# Altium footprint library Connectors THD.PcbLib: 631 footprints (part 20 of 46) (continued)
## HARTING_09 72 164 6904 [mm] "DIN 41612, Type Q, Thru-Hole Press-in; Rows a+b, 64 Position, Straight Male Connector" (continued)
Mechanical 14:
  circle w0.1: c2.24,-84.37 r1.4
  circle w0.1: c2.24,5.63 r1.4
  lines w0.1: -1.83,-83.32 -1.83,-86.87 5.57,-86.87 5.57,8.13 -1.83,8.13 -1.83,4.58 ; -0.81,-86.87 -0.81,-84.37 0.749,-81.67 3.731,-81.67 ; -0.81,8.13 -0.81,5.63 0.749,2.93 3.731,2.93 ; -0.204,-83.32 -3.03,-83.32 -3.03,4.58 -0.204,4.58 ; 0.2,-82.62 -2.48,-82.62 -2.48,3.88 ; 0.2,3.88 -2.48,3.88 ; 0.576,-81.97 -1.83,-81.97 -1.83,3.23 0.576,3.23 ; 1.67,-81.67 1.52,-81.52 ; 1.67,2.93 1.52,2.78 ; 1.97,-81.67 1.97,-81.02 4.37,-81.02 4.37,2.28 1.97,2.28 1.97,2.93 ; 2.62,-81.67 1.52,-80.57 ; 2.62,2.93 1.52,1.83 ; 5.57,-83.323 4.684,-83.32 3.731,-81.67 ; 5.57,4.58 4.684,4.58 3.731,2.93 ; -2.48,3.88 -1.38,2.78 ; -1.38,2.78 -1.38,-81.52 1.52,-81.52 ; -1.38,2.78 1.52,2.78 ; 1.52,-81.52 1.52,-80.57 ; 1.52,-80.57 3.92,-80.57 ; 1.52,1.83 1.52,2.78 ; 1.52,1.83 3.92,1.83 ; 3.731,-81.67 5.02,-81.67 ; 3.731,2.93 5.02,2.93 ; 3.92,-80.57 5.02,-81.67 ; 3.92,-80.57 3.92,1.83 ; 3.92,1.83 5.02,2.93 ; 5.02,-81.67 5.02,2.93
  text "30" at -5.6,-74.36 h1.2
  text "25" at -5.6,-61.66 h1.2
  text "20" at -5.6,-48.96 h1.2
  text "15" at -5.3,-36.26 h1.2
  text "10" at -5.3,-23.56 h1.2
  text "5" at -4.375,-10.91 h1.2
  text "32" at -5.6,-79.44 h1.2
  text "a" at -0.451,1.385 h1.2
  text "1" at -4.175,-0.75 h1.2
Drill Drawing:
  lines w0.1: -1.83,-59.13 -1.83,-80.585 3.92,-80.585 3.92,1.83 -1.83,1.83 -1.83,-21.03
  text "PRESS-FIT TECHNOLOGY diam. 1mm +0.1 -0" at -1.315,-57.225 h1
3D body: height 11.6, standoff -4.8, extent -3.03,-86.87 5.57,8.13

## HARTING_09 73 264 6801 [mm] "Connector; DIN 41612, Har-Bus Type R, Thru-Hole; Rows a+c, 64 Position; Right Angle"
height 9.5
pads (66):
  round 1.7 hole 1: a1(0,0) a2(0,-2.54) a3(0,-5.08) a4(0,-7.62) a5(0,-10.16) a6(0,-12.7) a7(0,-15.24) a8(0,-17.78) a9(0,-20.32) a10(0,-22.86) a11(0,-25.4) a12(0,-27.94) a13(0,-30.48) a14(0,-33.02) a15(0,-35.56) a16(0,-38.1) a17(0,-40.64) a18(0,-43.18) a19(0,-45.72) a20(0,-48.26) a21(0,-50.8) a22(0,-53.34) a23(0,-55.88) a24(0,-58.42) a25(0,-60.96) a26(0,-63.5) a27(0,-66.04) a28(0,-68.58) a29(0,-71.12) a30(0,-73.66) a31(0,-76.2) a32(0,-78.74) c1(-5.08,0) c2(-5.08,-2.54) c3(-5.08,-5.08) c4(-5.08,-7.62) c5(-5.08,-10.16) c6(-5.08,-12.7) c7(-5.08,-15.24) c8(-5.08,-17.78) c9(-5.08,-20.32) c10(-5.08,-22.86) c11(-5.08,-25.4) c12(-5.08,-27.94) c13(-5.08,-30.48) c14(-5.08,-33.02) c15(-5.08,-35.56) c16(-5.08,-38.1) c17(-5.08,-40.64) c18(-5.08,-43.18) c19(-5.08,-45.72) c20(-5.08,-48.26) c21(-5.08,-50.8) c22(-5.08,-53.34) c23(-5.08,-55.88) c24(-5.08,-58.42) c25(-5.08,-60.96) c26(-5.08,-63.5) c27(-5.08,-66.04) c28(-5.08,-68.58) c29(-5.08,-71.12) c30(-5.08,-73.66) c31(-5.08,-76.2) c32(-5.08,-78.74)
  round 3.5 / inner round 3.5 / far side round 5.1 hole 2.8: MTG1(2.54,5.08) MTG2(2.54,-83.82)
Top Overlay:
  lines w0.2: 1.738,-86.32 0.01,-86.32 0.01,-81.395 1.14,-81.395 1.14,2.655 0.01,2.655 0.01,7.58 1.738,7.58 ; 3.556,-86.32 6.14,-86.32 6.14,-84.003 6.14,5.263 6.14,7.58 3.556,7.58 ; 6.14,-81.845 12.06,-81.845 ; 6.14,-80.795 6.77,-80.795 12.06,-80.795 ; 6.14,2.055 6.77,2.055 12.06,2.055 ; 6.14,3.105 12.06,3.105 ; 12.06,-81.845 12.06,-80.795 ; 12.06,-81.845 12.69,-81.215 12.69,-80.165 ; 12.06,-80.795 12.06,2.055 ; 12.06,-80.795 12.69,-80.165 ; 12.06,2.055 12.06,3.105 ; 12.06,2.055 12.69,1.425 ; 12.06,3.105 12.69,2.475 12.69,1.425 ; 12.69,-80.165 12.69,1.425
  text "20" at -8.12,-48.835 h1.2
  text "15" at -8.02,-36.235 h1.2
  text "a" at -0.6,2.04 h1.2
  text "c" at -4.58,2.04 h1.2
  text "25" at -8.1,-61.6 h1.2
  text "32" at -8.12,-79.315 h1.2
  text "10" at -8.02,-23.535 h1.2
  text "30" at -8.12,-74.235 h1.2
  text "1" at -6.695,-0.725 h1.2
  text "5" at -6.895,-10.785 h1.2
Mechanical 8:
  lines w0.1: -5.08,-39.37 12.64,-39.37 ; 5.3,-86.3 5.3,7.5
Mechanical 14:
  circle w0.1: c2.54,5.08 r1.4
  circle w0.1: c2.54,-83.82 r1.4
  lines w0.1: 1.14,-77.97 5.59,-77.97 ; 1.14,-76.97 5.59,-76.97 ; 1.14,-52.57 5.59,-52.57 ; 1.14,-51.57 5.59,-51.57 ; 1.14,-27.17 5.59,-27.17 ; 1.14,-26.17 5.59,-26.17 ; 1.14,-1.77 5.59,-1.77 ; 1.14,-0.77 5.59,-0.77 ; 1.297,5.08 2.54,5.08 ; 6.14,-81.845 12.06,-81.845 ; 6.14,-80.795 6.77,-80.795 ; 6.14,2.055 6.77,2.055 ; 6.14,3.105 12.06,3.105 ; 1.14,-81.395 0.01,-81.395 0.01,-86.32 6.14,-86.32 6.14,-84.003 ; 1.14,-81.395 4.084,-81.395 5.59,-84.003 ; 1.14,-81.395 1.14,2.655 ; 1.14,2.655 0.01,2.655 0.01,7.58 6.14,7.58 6.14,5.263 ; 1.14,2.655 4.084,2.655 5.59,5.263 ; 5.59,-84.003 6.14,-84.003 ; 5.59,-84.003 5.59,-77.72 1.69,-77.72 1.69,-77.22 5.59,-77.22 5.59,-52.32 1.69,-52.32 1.69,-51.82 5.59,-51.82 5.59,-26.92 1.69,-26.92 1.69,-26.42 5.59,-26.42 5.59,-1.52 1.69,-1.52 1.69,-1.02 5.59,-1.02 5.59,5.263 ; 5.59,5.263 6.14,5.263 ; 6.14,-84.003 6.14,5.263 ; 6.77,-80.795 6.77,2.055 ; 6.77,-80.795 12.06,-80.795 ; 6.77,2.055 12.06,2.055 ; 12.06,-81.845 12.06,-80.795 ; 12.06,-81.845 12.69,-81.215 12.69,-80.165 ; 12.06,-80.795 12.06,2.055 ; 12.06,-80.795 12.69,-80.165 ; 12.06,2.055 12.06,3.105 ; 12.06,2.055 12.69,1.425 ; 12.06,3.105 12.69,2.475 12.69,1.425 ; 12.69,-80.165 12.69,1.425
  text "a" at -0.6,2.04 h1.2
  text "c" at -4.58,2.04 h1.2
  text "30" at -8.12,-74.235 h1.2
  text "20" at -8.12,-48.835 h1.2
  text "15" at -8.02,-36.235 h1.2
  text "32" at -8.12,-79.315 h1.2
  text "1" at -6.695,-0.725 h1.2
  text "25" at -8.1,-61.6 h1.2
  text "10" at -8.02,-23.535 h1.2
  text "5" at -6.895,-10.785 h1.2
3D body: height 9.1, standoff -3, extent -5.38,-86.37 12.74,7.63

## HARTING_09 73 296 6801 [mm] "Connector; DIN 41612, Type R, Thru-Hole; Rows a+b+c, 96 Position; Right Angle"
height 9.5
pads (98):
  round 1.7 hole 1: a1(0,0) a2(0,-2.54) a3(0,-5.08) a4(0,-7.62) a5(0,-10.16) a6(0,-12.7) a7(0,-15.24) a8(0,-17.78) a9(0,-20.32) a10(0,-22.86) a11(0,-25.4) a12(0,-27.94) a13(0,-30.48) a14(0,-33.02) a15(0,-35.56) a16(0,-38.1) a17(0,-40.64) a18(0,-43.18) a19(0,-45.72) a20(0,-48.26) a21(0,-50.8) a22(0,-53.34) a23(0,-55.88) a24(0,-58.42) a25(0,-60.96) a26(0,-63.5) a27(0,-66.04) a28(0,-68.58) a29(0,-71.12) a30(0,-73.66) a31(0,-76.2) a32(0,-78.74) b1(-2.54,0) b2(-2.54,-2.54) b3(-2.54,-5.08) b4(-2.54,-7.62) b5(-2.54,-10.16) b6(-2.54,-12.7) b7(-2.54,-15.24) b8(-2.54,-17.78) b9(-2.54,-20.32) b10(-2.54,-22.86) b11(-2.54,-25.4) b12(-2.54,-27.94) b13(-2.54,-30.48) b14(-2.54,-33.02) b15(-2.54,-35.56) b16(-2.54,-38.1) b17(-2.54,-40.64) b18(-2.54,-43.18) b19(-2.54,-45.72) b20(-2.54,-48.26) b21(-2.54,-50.8) b22(-2.54,-53.34) b23(-2.54,-55.88) b24(-2.54,-58.42) b25(-2.54,-60.96) b26(-2.54,-63.5) b27(-2.54,-66.04) b28(-2.54,-68.58) b29(-2.54,-71.12) b30(-2.54,-73.66) b31(-2.54,-76.2) b32(-2.54,-78.74) c1(-5.08,0) c2(-5.08,-2.54) c3(-5.08,-5.08) c4(-5.08,-7.62) c5(-5.08,-10.16) c6(-5.08,-12.7) c7(-5.08,-15.24) c8(-5.08,-17.78) c9(-5.08,-20.32) c10(-5.08,-22.86) c11(-5.08,-25.4) c12(-5.08,-27.94) c13(-5.08,-30.48) c14(-5.08,-33.02) c15(-5.08,-35.56) c16(-5.08,-38.1) c17(-5.08,-40.64) c18(-5.08,-43.18) c19(-5.08,-45.72) c20(-5.08,-48.26) c21(-5.08,-50.8) c22(-5.08,-53.34) c23(-5.08,-55.88) c24(-5.08,-58.42) c25(-5.08,-60.96) c26(-5.08,-63.5) c27(-5.08,-66.04) c28(-5.08,-68.58) c29(-5.08,-71.12) c30(-5.08,-73.66) c31(-5.08,-76.2) c32(-5.08,-78.74)
  round 3.5 / inner round 3.5 / far side round 5.1 hole 2.8: MTG1(2.54,5.08) MTG2(2.54,-83.82)
Top Overlay:
  lines w0.2: 1.738,-86.32 0.01,-86.32 0.01,-81.395 1.14,-81.395 1.14,2.655 0.01,2.655 0.01,7.58 1.738,7.58 ; 3.556,-86.32 6.14,-86.32 6.14,-84.003 6.14,5.263 6.14,7.58 3.556,7.58 ; 6.14,-81.845 12.06,-81.845 ; 6.14,-80.795 6.77,-80.795 12.06,-80.795 ; 6.14,2.055 6.77,2.055 12.06,2.055 ; 6.14,3.105 12.06,3.105 ; 12.06,-81.845 12.06,-80.795 ; 12.06,-81.845 12.69,-81.215 12.69,-80.165 ; 12.06,-80.795 12.06,2.055 ; 12.06,-80.795 12.69,-80.165 ; 12.06,2.055 12.06,3.105 ; 12.06,2.055 12.69,1.425 ; 12.06,3.105 12.69,2.475 12.69,1.425 ; 12.69,-80.165 12.69,1.425
  text "20" at -8.12,-48.835 h1.2
  text "15" at -8.02,-36.235 h1.2
  text "a" at -0.6,2.04 h1.2
  text "b" at -2.04,2.04 h1.2
  text "c" at -4.58,2.04 h1.2
  text "25" at -8.1,-61.6 h1.2
  text "32" at -8.12,-79.315 h1.2
  text "10" at -8.02,-23.535 h1.2
  text "30" at -8.12,-74.235 h1.2
  text "1" at -6.695,-0.725 h1.2
  text "5" at -6.895,-10.785 h1.2
Mechanical 8:
  lines w0.1: -5.08,-39.37 12.64,-39.37 ; 5.3,-86.3 5.3,7.5
Mechanical 14:
  circle w0.1: c2.54,5.08 r1.4
  circle w0.1: c2.54,-83.82 r1.4
  lines w0.1: 1.14,-77.97 5.59,-77.97 ; 1.14,-76.97 5.59,-76.97 ; 1.14,-52.57 5.59,-52.57 ; 1.14,-51.57 5.59,-51.57 ; 1.14,-27.17 5.59,-27.17 ; 1.14,-26.17 5.59,-26.17 ; 1.14,-1.77 5.59,-1.77 ; 1.14,-0.77 5.59,-0.77 ; 1.297,5.08 2.54,5.08 ; 6.14,-81.845 12.06,-81.845 ; 6.14,-80.795 6.77,-80.795 ; 6.14,2.055 6.77,2.055 ; 6.14,3.105 12.06,3.105 ; 1.14,-81.395 0.01,-81.395 0.01,-86.32 6.14,-86.32 6.14,-84.003 ; 1.14,-81.395 4.084,-81.395 5.59,-84.003 ; 1.14,-81.395 1.14,2.655 ; 1.14,2.655 0.01,2.655 0.01,7.58 6.14,7.58 6.14,5.263 ; 1.14,2.655 4.084,2.655 5.59,5.263 ; 5.59,-84.003 6.14,-84.003 ; 5.59,-84.003 5.59,-77.72 1.69,-77.72 1.69,-77.22 5.59,-77.22 5.59,-52.32 1.69,-52.32 1.69,-51.82 5.59,-51.82 5.59,-26.92 1.69,-26.92 1.69,-26.42 5.59,-26.42 5.59,-1.52 1.69,-1.52 1.69,-1.02 5.59,-1.02 5.59,5.263 ; 5.59,5.263 6.14,5.263 ; 6.14,-84.003 6.14,5.263 ; 6.77,-80.795 6.77,2.055 ; 6.77,-80.795 12.06,-80.795 ; 6.77,2.055 12.06,2.055 ; 12.06,-81.845 12.06,-80.795 ; 12.06,-81.845 12.69,-81.215 12.69,-80.165 ; 12.06,-80.795 12.06,2.055 ; 12.06,-80.795 12.69,-80.165 ; 12.06,2.055 12.06,3.105 ; 12.06,2.055 12.69,1.425 ; 12.06,3.105 12.69,2.475 12.69,1.425 ; 12.69,-80.165 12.69,1.425
  text "a" at -0.6,2.04 h1.2
  text "b" at -2.04,2.04 h1.2
  text "c" at -4.58,2.04 h1.2
  text "30" at -8.12,-74.235 h1.2
  text "20" at -8.12,-48.835 h1.2
  text "15" at -8.02,-36.235 h1.2
  text "32" at -8.12,-79.315 h1.2
  text "1" at -6.695,-0.725 h1.2
  text "25" at -8.1,-61.6 h1.2
  text "10" at -8.02,-23.535 h1.2
  text "5" at -6.895,-10.785 h1.2
3D body: height 9.1, standoff -3, extent -5.38,-86.37 12.74,7.63

## HARTING_09 79 196 6903 [mm] "DIN 41612, Type RL, 96 Position, Rows a+b+c, Performance level 2, Straight Male Connector, Lead 4.0 mm, Pitch 2.54mm"
height 11.6
pads (98):
  round 1.7 hole 1: a1(0,0) a2(0,-2.54) a3(0,-5.08) a4(0,-7.62) a5(0,-10.16) a6(0,-12.7) a7(0,-15.24) a8(0,-17.78) a9(0,-20.32) a10(0,-22.86) a11(0,-25.4) a12(0,-27.94) a13(0,-30.48) a14(0,-33.02) a15(0,-35.56) a16(0,-38.1) a17(0,-40.64) a18(0,-43.18) a19(0,-45.72) a20(0,-48.26) a21(0,-50.8) a22(0,-53.34) a23(0,-55.88) a24(0,-58.42) a25(0,-60.96) a26(0,-63.5) a27(0,-66.04) a28(0,-68.58) a29(0,-71.12) a30(0,-73.66) a31(0,-76.2) a32(0,-78.74) b1(2.54,0) b2(2.54,-2.54) b3(2.54,-5.08) b4(2.54,-7.62) b5(2.54,-10.16) b6(2.54,-12.7) b7(2.54,-15.24) b8(2.54,-17.78) b9(2.54,-20.32) b10(2.54,-22.86) b11(2.54,-25.4) b12(2.54,-27.94) b13(2.54,-30.48) b14(2.54,-33.02) b15(2.54,-35.56) b16(2.54,-38.1) b17(2.54,-40.64) b18(2.54,-43.18) b19(2.54,-45.72) b20(2.54,-48.26) b21(2.54,-50.8) b22(2.54,-53.34) b23(2.54,-55.88) b24(2.54,-58.42) b25(2.54,-60.96) b26(2.54,-63.5) b27(2.54,-66.04) b28(2.54,-68.58) b29(2.54,-71.12) b30(2.54,-73.66) b31(2.54,-76.2) b32(2.54,-78.74) c1(5.08,0) c2(5.08,-2.54) c3(5.08,-5.08) c4(5.08,-7.62) c5(5.08,-10.16) c6(5.08,-12.7) c7(5.08,-15.24) c8(5.08,-17.78) c9(5.08,-20.32) c10(5.08,-22.86) c11(5.08,-25.4) c12(5.08,-27.94) c13(5.08,-30.48) c14(5.08,-33.02) c15(5.08,-35.56) c16(5.08,-38.1) c17(5.08,-40.64) c18(5.08,-43.18) c19(5.08,-45.72) c20(5.08,-48.26) c21(5.08,-50.8) c22(5.08,-53.34) c23(5.08,-55.88) c24(5.08,-58.42) c25(5.08,-60.96) c26(5.08,-63.5) c27(5.08,-66.04) c28(5.08,-68.58) c29(5.08,-71.12) c30(5.08,-73.66) c31(5.08,-76.2) c32(5.08,-78.74)
  round 3.5 / inner round 3.5 / far side round 5.1 hole 2.8: MTG1(1.81,5.63) MTG2(1.81,-84.37)
Top Overlay:
  lines w0.2: -1.835,-83.32 -1.835,-86.87 0.152,-86.87 ; -1.835,4.58 -1.835,8.13 0.152,8.13 ; -1.36,-79.484 -1.36,-81.47 ; -1.36,0.744 -1.36,2.83 ; -1,-83.32 -3.01,-83.32 -3.01,4.58 -1,4.58 ; -0.89,-86.87 -0.89,-85.678 ; -0.89,-83.062 -0.89,-81.92 ; -0.89,-82.57 -2.46,-82.57 ; -0.89,3.28 -0.89,4.322 ; -0.89,3.93 -2.46,3.93 ; -0.89,6.938 -0.89,8.13 ; -0.055,3.28 -1.81,3.28 -1.81,-81.92 0.079,-81.92 ; 0.733,2.83 -1.36,2.83 ; 1.042,-81.47 -1.36,-81.47 ; 2.578,-81.47 4.06,-81.47 ; 2.887,2.83 4.06,2.83 ; 3.468,-86.87 6.915,-86.87 6.915,-83.32 ; 3.468,8.13 6.915,8.13 6.915,4.58 ; 3.541,-81.92 4.51,-81.92 4.06,-81.47 ; 3.675,3.28 4.51,3.28 4.06,2.83 ; 4.51,-86.87 4.51,-85.678 ; 4.51,-83.062 4.51,-80.97 ; 4.51,-81.62 7.54,-81.62 ; 4.51,2.98 7.54,2.98 ; 4.51,4.322 4.51,2.33 ; 4.51,6.938 4.51,8.13 ; 4.62,-83.32 8.09,-83.32 8.09,4.58 4.62,4.58 ; 6.44,-79.484 6.44,-80.52 ; 6.44,0.744 6.44,1.88 ; -2.46,-82.57 -1.36,-81.47 ; -2.46,-82.57 -2.46,3.93 ; -2.46,3.93 -1.36,2.83 ; 4.06,-81.47 4.06,-80.52 ; 4.06,-80.52 4.51,-80.97 ; 4.06,-80.52 6.44,-80.52 ; 4.06,1.88 4.51,2.33 ; 4.06,1.88 6.44,1.88 ; 4.06,1.88 4.06,2.83 ; 4.51,-80.97 6.89,-80.97 6.89,2.33 4.51,2.33 ; 6.44,-80.52 7.54,-81.62 ; 6.44,1.88 7.54,2.98 ; 7.54,-81.62 7.54,2.98
  text "1" at -4.127,-0.6 h1.2
  text "5" at -4.763,-10.76 h1.2
  text "a" at -0.318,1.587 h1.2
  text "b" at 1.27,1.587 h1.2
  text "c" at 2.857,1.587 h1.2
  text "10" at -5.715,-23.46 h1.2
  text "15" at -5.715,-36.16 h1.2
  text "20" at -5.715,-48.86 h1.2
  text "25" at -5.715,-61.56 h1.2
  text "30" at -5.715,-74.26 h1.2
  text "32" at -5.715,-79.34 h1.2
Mechanical 8:
  drawing of 400 lines, arcs and shapes, not listed
Mechanical 14:
  circle w0.1: c1.81,-84.37 r1.4
  circle w0.1: c1.81,5.63 r1.4
  lines w0.1: -1.835,-83.32 -1.835,-86.87 6.915,-86.87 6.915,-83.32 ; -1.835,4.58 -1.835,8.13 6.915,8.13 6.915,4.58 ; -0.89,-86.87 -0.89,-81.92 ; -0.89,-83.32 -3.01,-83.32 -3.01,4.58 -0.89,4.58 ; -0.89,-82.82 0.288,-82.82 cw(c1.81,-84.74) 3.332,-82.82 4.51,-82.82 ; -0.89,-82.57 -2.46,-82.57 ; -0.89,3.28 -0.89,8.13 ; -0.89,3.93 -2.46,3.93 ; -0.89,4.08 0.288,4.08 ccw(c1.81,6) 3.332,4.08 4.51,4.08 ; 4.51,-86.87 4.51,-80.97 ; 4.51,-83.32 8.09,-83.32 8.09,4.58 4.51,4.58 ; 4.51,-81.62 7.54,-81.62 ; 4.51,2.98 7.54,2.98 ; 4.51,8.13 4.51,2.33 ; -2.46,-82.57 -1.36,-81.47 ; -2.46,-82.57 -2.46,3.93 ; -2.46,3.93 -1.36,2.83 ; -1.36,-81.47 -1.36,2.83 ; -1.36,-81.47 4.06,-81.47 ; -1.36,2.83 4.06,2.83 ; 4.06,-81.47 4.51,-81.92 -1.81,-81.92 -1.81,3.28 4.51,3.28 4.06,2.83 ; 4.06,-81.47 4.06,-80.52 ; 4.06,-80.52 4.51,-80.97 ; 4.06,-80.52 6.44,-80.52 ; 4.06,1.88 4.51,2.33 ; 4.06,1.88 6.44,1.88 ; 4.06,1.88 4.06,2.83 ; 4.51,-80.97 6.89,-80.97 6.89,2.33 4.51,2.33 ; 6.44,-80.52 7.54,-81.62 ; 6.44,-80.52 6.44,1.88 ; 6.44,1.88 7.54,2.98 ; 7.54,-81.62 7.54,2.98
  text "32" at -5.715,-79.34 h1.2
  text "30" at -5.715,-74.26 h1.2
  text "25" at -5.715,-61.56 h1.2
  text "20" at -5.715,-48.86 h1.2
  text "15" at -5.715,-36.16 h1.2
  text "10" at -5.715,-23.46 h1.2
  text "c" at 2.857,1.587 h1.2
  text "b" at 1.27,1.587 h1.2
  text "a" at -0.318,1.587 h1.2
  text "5" at -4.763,-10.76 h1.2
  text "1" at -4.127,-0.6 h1.2
3D body: height 11.6, standoff -2.5, extent -3.01,-86.87 8.09,8.13

## HARTING_16 21 170 1303 000 [mm] "170 Poles, Extended Side, AdvancedMC-Plug-Connector"
height 2.44
pads (172):
  round 1.15 hole 0.55: 1(-31.5,-3.5) 2(-30.75,-0.75) 3(-30,-2) 4(-29.25,-3.5) 5(-28.5,-0.75) 6(-27.75,-2) 7(-27,-3.5) 8(-26.25,-0.75) 9(-25.5,-2) 10(-24.75,-3.5) 11(-24,-0.75) 12(-23.25,-2) 13(-22.5,-3.5) 14(-21.75,-0.75) 15(-21,-2) 16(-20.25,-3.5) 17(-19.5,-0.75) 18(-18.75,-2) 19(-18,-3.5) 20(-17.25,-0.75) 21(-16.5,-2) 22(-15.75,-3.5) 23(-15,-0.75) 24(-14.25,-2) 25(-13.5,-3.5) 26(-12.75,-0.75) 27(-12,-2) 28(-11.25,-3.5) 29(-10.5,-0.75) 30(-9.75,-2) 31(-9,-3.5) 32(-8.25,-0.75) 33(-7.5,-2) 34(-6.75,-3.5) 35(-6,-0.75) 36(-5.25,-2) 37(-4.5,-3.5) 38(-3.75,-0.75) 39(-3,-2) 40(-2.25,-3.5) 41(-1.5,-0.75) 42(-0.75,-2) 43(0,-3.5) 44(0.75,-0.75) 45(1.5,-2) 46(2.25,-3.5) 47(3,-0.75) 48(3.75,-2) 49(4.5,-3.5) 50(5.25,-0.75) 51(6,-2) 52(6.75,-3.5) 53(7.5,-0.75) 54(8.25,-2) 55(9,-3.5) 56(9.75,-0.75) 57(10.5,-2) 58(11.25,-3.5) 59(12,-0.75) 60(12.75,-2) 61(13.5,-3.5) 62(14.25,-0.75) 63(15,-2) 64(15.75,-3.5) 65(16.5,-0.75) 66(17.25,-2) 67(18,-3.5) 68(18.75,-0.75) 69(19.5,-2) 70(20.25,-3.5) 71(21,-0.75) 72(21.75,-2) 73(22.5,-3.5) 74(23.25,-0.75) 75(24,-2) 76(24.75,-3.5) 77(25.5,-0.75) 78(26.25,-2) 79(27,-3.5) 80(27.75,-0.75) 81(28.5,-2) 82(29.25,-3.5) 83(30,-0.75) 84(30.75,-2) 85(31.5,-3.5) 86(31.5,0.75) 87(30.75,3.5) 88(30,2.25) 89(29.25,0.75) 90(28.5,3.5) 91(27.75,2.25) 92(27,0.75) 93(26.25,3.5) 94(25.5,2.25) 95(24.75,0.75) 96(24,3.5) 97(23.25,2.25) 98(22.5,0.75) 99(21.75,3.5) 100(21,2.25) 101(20.25,0.75) 102(19.5,3.5) 103(18.75,2.25) 104(18,0.75) 105(17.25,3.5) 106(16.5,2.25) 107(15.75,0.75) 108(15,3.5) 109(14.25,2.25) 110(13.5,0.75) 111(12.75,3.5) 112(12,2.25) 113(11.25,0.75) 114(10.5,3.5) 115(9.75,2.25) 116(9,0.75) 117(8.25,3.5) 118(7.5,2.25) 119(6.75,0.75) 120(6,3.5) 121(5.25,2.25) 122(4.5,0.75) 123(3.75,3.5) 124(3,2.25) 125(2.25,0.75) 126(1.5,3.5) 127(0.75,2.25) 128(0,0.75) 129(-0.75,3.5) 130(-1.5,2.25) 131(-2.25,0.75) 132(-3,3.5) 133(-3.75,2.25) 134(-4.5,0.75) 135(-5.25,3.5) 136(-6,2.25) 137(-6.75,0.75) 138(-7.5,3.5) 139(-8.25,2.25) 140(-9,0.75) 141(-9.75,3.5) 142(-10.5,2.25) 143(-11.25,0.75) 144(-12,3.5) 145(-12.75,2.25) 146(-13.5,0.75) 147(-14.25,3.5) 148(-15,2.25) 149(-15.75,0.75) 150(-16.5,3.5) 151(-17.25,2.25) 152(-18,0.75) 153(-18.75,3.5) 154(-19.5,2.25) 155(-20.25,0.75) 156(-21,3.5) 157(-21.75,2.25) 158(-22.5,0.75) 159(-23.25,3.5) 160(-24,2.25) 161(-24.75,0.75) 162(-25.5,3.5) 163(-26.25,2.25) 164(-27,0.75) 165(-27.75,3.5) 166(-28.5,2.25) 167(-29.25,0.75) 168(-30,3.5) 169(-30.75,2.25) 170(-31.5,0.75)
  round 1 hole 1.5 unplated mask+0.25: 171(-33.775,5) 172(33.775,5)
Top Overlay:
  circle w0.2: c-33.775,1.55 r0.735
  circle w0.2: c-33.775,-0.95 r0.735
  circle w0.2: c-33.775,-3.45 r0.735
  circle w0.2: c33.775,-3.45 r0.735
  circle w0.2: c33.775,-0.95 r0.735
  circle w0.2: c33.775,1.55 r0.735
  lines w0.2: -33.49,-5.2 -31.99,-5.2 ; -32.6,0.078 -32.307,0.078 ; -32.6,3.922 -30.961,3.922 ; -32.525,-11.2 -31.74,-11.2 ; -32.525,-11.068 32.525,-11.068 ; -32.525,-10.935 32.525,-10.935 ; -32.525,-7.4 32.525,-7.4 ; -32.525,-6.872 32.525,-6.872 ; -32.525,-6.009 32.525,-6.009 ; -32.525,-5.6 -33,-5.6 cw(c-33,-5.1) -33.5,-5.1 -33.5,-4.9 -33.95,-4.9 cw(c-33.95,-3.9) -34.95,-3.9 -34.95,6.8 cw(c-34.45,6.8) -34.45,7.3 -33.1,7.3 cw(c-33.1,6.8) -32.6,6.8 -32.6,4.8 32.6,4.8 32.6,6.8 cw(c33.1,6.8) 33.1,7.3 34.45,7.3 cw(c34.45,6.8) 34.95,6.8 34.95,-3.9 cw(c33.95,-3.9) 33.95,-4.9 33.5,-4.9 33.49,-5.2 31.99,-5.2 ; -32.18,-0.05 -32.6,-0.05 -32.6,4.3 -30.68,4.3 ; -31.74,-11.068 -31.74,-14.98 -31.26,-14.98 -31.26,-11.068 ; -31.26,-11.2 -30.99,-11.2 ; -30.99,-11.068 -30.99,-13.58 -30.51,-13.58 -30.51,-11.068 ; -30.51,-11.2 -30.24,-11.2 ; -30.24,-11.068 -30.24,-13.58 -29.76,-13.58 -29.76,-11.068 ; -29.76,-11.2 -29.49,-11.2 ; -29.49,-11.068 -29.49,-13.58 -29.01,-13.58 -29.01,-11.068 ; -29.01,-11.2 -28.74,-11.2 ; -28.74,-11.068 -28.74,-13.58 -28.26,-13.58 -28.26,-11.068 ; -28.26,-11.2 -27.99,-11.2 ; -27.99,-11.068 -27.99,-13.58 -27.51,-13.58 -27.51,-11.068 ; -27.51,-11.2 27.51,-11.2 ; 27.51,-11.068 27.51,-13.58 27.99,-13.58 27.99,-11.068 ; 27.99,-11.2 28.26,-11.2 ; 28.26,-11.068 28.26,-13.58 28.74,-13.58 28.74,-11.068 ; 28.74,-11.2 29.01,-11.2 ; 29.01,-11.068 29.01,-14.98 29.49,-14.98 29.49,-11.068 ; 29.49,-11.2 29.76,-11.2 ; 29.76,-11.068 29.76,-13.58 30.24,-13.58 30.24,-11.068 ; 30.24,-11.2 30.51,-11.2 ; 30.51,-11.068 30.51,-13.58 30.99,-13.58 30.99,-11.068 ; 30.99,-11.2 31.26,-11.2 ; 31.26,-11.068 31.26,-14.98 31.74,-14.98 31.74,-11.068 ; 31.43,4.3 32.6,4.3 32.6,-0.05 32.18,-0.05 ; 31.711,3.922 32.6,3.922 ; 31.74,-11.2 32.525,-11.2 ; 32.026,-15.594 32.379,-15.246 ccw(c32.025,-14.893) 32.525,-14.893 32.525,-5.377 ; 32.049,-15.574 cw(c31.718,-15.2) 31.718,-15.7 -31.718,-15.7 cw(c-31.718,-15.2) -32.026,-15.594 -32.379,-15.246 cw(c-32.025,-14.893) -32.525,-14.893 -32.525,-5.377 -31.99,-5.359 -31.99,-5.093 31.99,-5.093 31.99,-5.359 32.525,-5.359 ; 32.308,0.079 32.6,0.079 ; 32.525,-5.6 33,-5.6 ccw(c33,-5.1) 33.5,-5.1
Mechanical 8:
  drawing of 704 lines, arcs and shapes, not listed
  text "PCB Edge" at -5.225,-7 h1.52
Mechanical 14:
  circle w0.1: c-33.775,1.55 r0.735
  circle w0.1: c-33.775,-0.95 r0.735
  circle w0.1: c-33.775,-3.45 r0.735
  circle w0.1: c33.775,-3.45 r0.735
  circle w0.1: c33.775,-0.95 r0.735
  circle w0.1: c33.775,1.55 r0.735
  circle w0.1: c-33.775,5 r0.735
  circle w0.1: c33.775,5 r0.735
  lines w0.1: -33.49,-5.2 -31.99,-5.2 ; -32.6,0.078 32.6,0.079 ; -32.6,3.922 32.6,3.922 ; -32.525,-11.2 -31.74,-11.2 ; -32.525,-11.068 32.525,-11.068 ; -32.525,-10.935 32.525,-10.935 ; -32.525,-7.4 32.525,-7.4 ; -32.525,-6.872 32.525,-6.872 ; -32.525,-6.009 32.525,-6.009 ; -32.525,-5.6 -33,-5.6 cw(c-33,-5.1) -33.5,-5.1 -33.5,-4.9 -33.95,-4.9 cw(c-33.95,-3.9) -34.95,-3.9 -34.95,6.8 cw(c-34.45,6.8) -34.45,7.3 -33.1,7.3 cw(c-33.1,6.8) -32.6,6.8 -32.6,4.8 32.6,4.8 32.6,6.8 cw(c33.1,6.8) 33.1,7.3 34.45,7.3 cw(c34.45,6.8) 34.95,6.8 34.95,-3.9 cw(c33.95,-3.9) 33.95,-4.9 33.5,-4.9 33.49,-5.2 31.99,-5.2 ; -31.74,-11.068 -31.74,-14.98 -31.26,-14.98 -31.26,-11.068 ; -31.26,-11.2 -30.99,-11.2 ; -30.99,-11.068 -30.99,-13.58 -30.51,-13.58 -30.51,-11.068 ; -30.51,-11.2 -30.24,-11.2 ; -30.24,-11.068 -30.24,-13.58 -29.76,-13.58 -29.76,-11.068 ; -29.76,-11.2 -29.49,-11.2 ; -29.49,-11.068 -29.49,-13.58 -29.01,-13.58 -29.01,-11.068 ; -29.01,-11.2 -28.74,-11.2 ; -28.74,-11.068 -28.74,-13.58 -28.26,-13.58 -28.26,-11.068 ; -28.26,-11.2 -27.99,-11.2 ; -27.99,-11.068 -27.99,-13.58 -27.51,-13.58 -27.51,-11.068 ; -27.51,-11.2 27.51,-11.2 ; 27.51,-11.068 27.51,-13.58 27.99,-13.58 27.99,-11.068 ; 27.99,-11.2 28.26,-11.2 ; 28.26,-11.068 28.26,-13.58 28.74,-13.58 28.74,-11.068 ; 28.74,-11.2 29.01,-11.2 ; 29.01,-11.068 29.01,-14.98 29.49,-14.98 29.49,-11.068 ; 29.49,-11.2 29.76,-11.2 ; 29.76,-11.068 29.76,-13.58 30.24,-13.58 30.24,-11.068 ; 30.24,-11.2 30.51,-11.2 ; 30.51,-11.068 30.51,-13.58 30.99,-13.58 30.99,-11.068 ; 30.99,-11.2 31.26,-11.2 ; 31.26,-11.068 31.26,-14.98 31.74,-14.98 31.74,-11.068 ; 31.74,-11.2 32.525,-11.2 ; 32.026,-15.594 32.379,-15.246 ccw(c32.025,-14.893) 32.525,-14.893 32.525,-5.377 ; 32.049,-15.574 cw(c31.718,-15.2) 31.718,-15.7 -31.718,-15.7 cw(c-31.718,-15.2) -32.026,-15.594 -32.379,-15.246 cw(c-32.025,-14.893) -32.525,-14.893 -32.525,-5.377 -31.99,-5.359 -31.99,-5.093 31.99,-5.093 31.99,-5.359 32.525,-5.359 ; 32.525,-5.6 33,-5.6 ccw(c33,-5.1) 33.5,-5.1 ; -32.6,-0.05 32.6,-0.05 32.6,4.3 -32.6,4.3 -32.6,-0.05
3D body: height 2.42, standoff -2.18, extent -34.95,-15.7 34.95,7.3

## HARTING_17 25 095 2102 [mm] "Type B19, 95 Contacts (abcde) Female Connector, Angled, HAR-BUS HM with Pre-installed Upper Shield (f)"
height 11
pads (105):
  round 1.1 hole 0.6: 1a(0,0) 1b(-2,0) 1c(-4,0) 1d(-6,0) 1e(-8,0) 1f(-10,0) 2a(0,-2) 2b(-2,-2) 2c(-4,-2) 2d(-6,-2) 2e(-8,-2) 3a(0,-4) 3b(-2,-4) 3c(-4,-4) 3d(-6,-4) 3e(-8,-4) 3f(-10,-4) 4a(0,-6) 4b(-2,-6) 4c(-4,-6) 4d(-6,-6) 4e(-8,-6) 5a(0,-8) 5b(-2,-8) 5c(-4,-8) 5d(-6,-8) 5e(-8,-8) 5f(-10,-8) 6a(0,-10) 6b(-2,-10) 6c(-4,-10) 6d(-6,-10) 6e(-8,-10) 7a(0,-12) 7b(-2,-12) 7c(-4,-12) 7d(-6,-12) 7e(-8,-12) 7f(-10,-12) 8a(0,-14) 8b(-2,-14) 8c(-4,-14) 8d(-6,-14) 8e(-8,-14) 9a(0,-16) 9b(-2,-16) 9c(-4,-16) 9d(-6,-16) 9e(-8,-16) 9f(-10,-16) 10a(0,-18) 10b(-2,-18) 10c(-4,-18) 10d(-6,-18) 10e(-8,-18) 11a(0,-20) 11b(-2,-20) 11c(-4,-20) 11d(-6,-20) 11e(-8,-20) 11f(-10,-20) 12a(0,-22) 12b(-2,-22) 12c(-4,-22) 12d(-6,-22) 12e(-8,-22) 13a(0,-24) 13b(-2,-24) 13c(-4,-24) 13d(-6,-24) 13e(-8,-24) 13f(-10,-24) 14a(0,-26) 14b(-2,-26) 14c(-4,-26) 14d(-6,-26) 14e(-8,-26) 15a(0,-28) 15b(-2,-28) 15c(-4,-28) 15d(-6,-28) 15e(-8,-28) 15f(-10,-28) 16a(0,-30) 16b(-2,-30) 16c(-4,-30) 16d(-6,-30) 16e(-8,-30) 17a(0,-32) 17b(-2,-32) 17c(-4,-32) 17d(-6,-32) 17e(-8,-32) 17f(-10,-32) 18a(0,-34) 18b(-2,-34) 18c(-4,-34) 18d(-6,-34) 18e(-8,-34) 19a(0,-36) 19b(-2,-36) 19c(-4,-36) 19d(-6,-36) 19e(-8,-36) 19f(-10,-36)
Top Overlay:
  drawing of 368 lines, arcs and shapes, not listed
  text "f" at -10.363,1.5 h1.2
  text "a" at -0.333,1.667 h1.2
  text "b" at -2.333,1.5 h1.2
  text "c" at -4.333,1.667 h1.2
  text "d" at -6.333,1.5 h1.2
  text "e" at -8.333,1.667 h1.2
  text "1" at -11.5,-0.25 h1.2
  text "19" at -11.5,-36.833 h1.2
Mechanical 8:
  lines w0.2: -11.5,-18 3,-18 ; 1.5,-36.9 1.5,0.9
  text "PCB" at 0.5,-20 h1.2
Mechanical 14:
  drawing of 521 lines, arcs and shapes, not listed
  text "19" at -11.5,-36.833 h1.2
  text "1" at -11.5,-0.25 h1.2
  text "f" at -10.363,1.5 h1.2
  text "e" at -8.333,1.667 h1.2
  text "d" at -6.333,1.5 h1.2
  text "c" at -4.333,1.667 h1.2
  text "b" at -2.333,1.5 h1.2
  text "a" at -0.333,1.667 h1.2
Drill Drawing:
  lines w0.1: -11,-37 1,-37 1,1 -11,1 -11,-37
  text "PRESS-FIT TECHNOLOGY diam. 0.6mm +0.05 -0" at 2.575,-35.648 h1
3D body: height 8.15, standoff -3.67, extent -10.1,-36.95 10.7,0.95